# Altium footprint library 我的封装库.PcbLib: 90 footprints (part 2 of 6)
Each footprint in its own frame and in the unit in brackets; x right, y up, seen from the top. Pads: shape width x height; smd on the part's side, far side on the other; paste and mask are expansions set on the pad; w line width, h text height; cw(c..) or ccw(c..) is an arc to the next point about the centre after c.
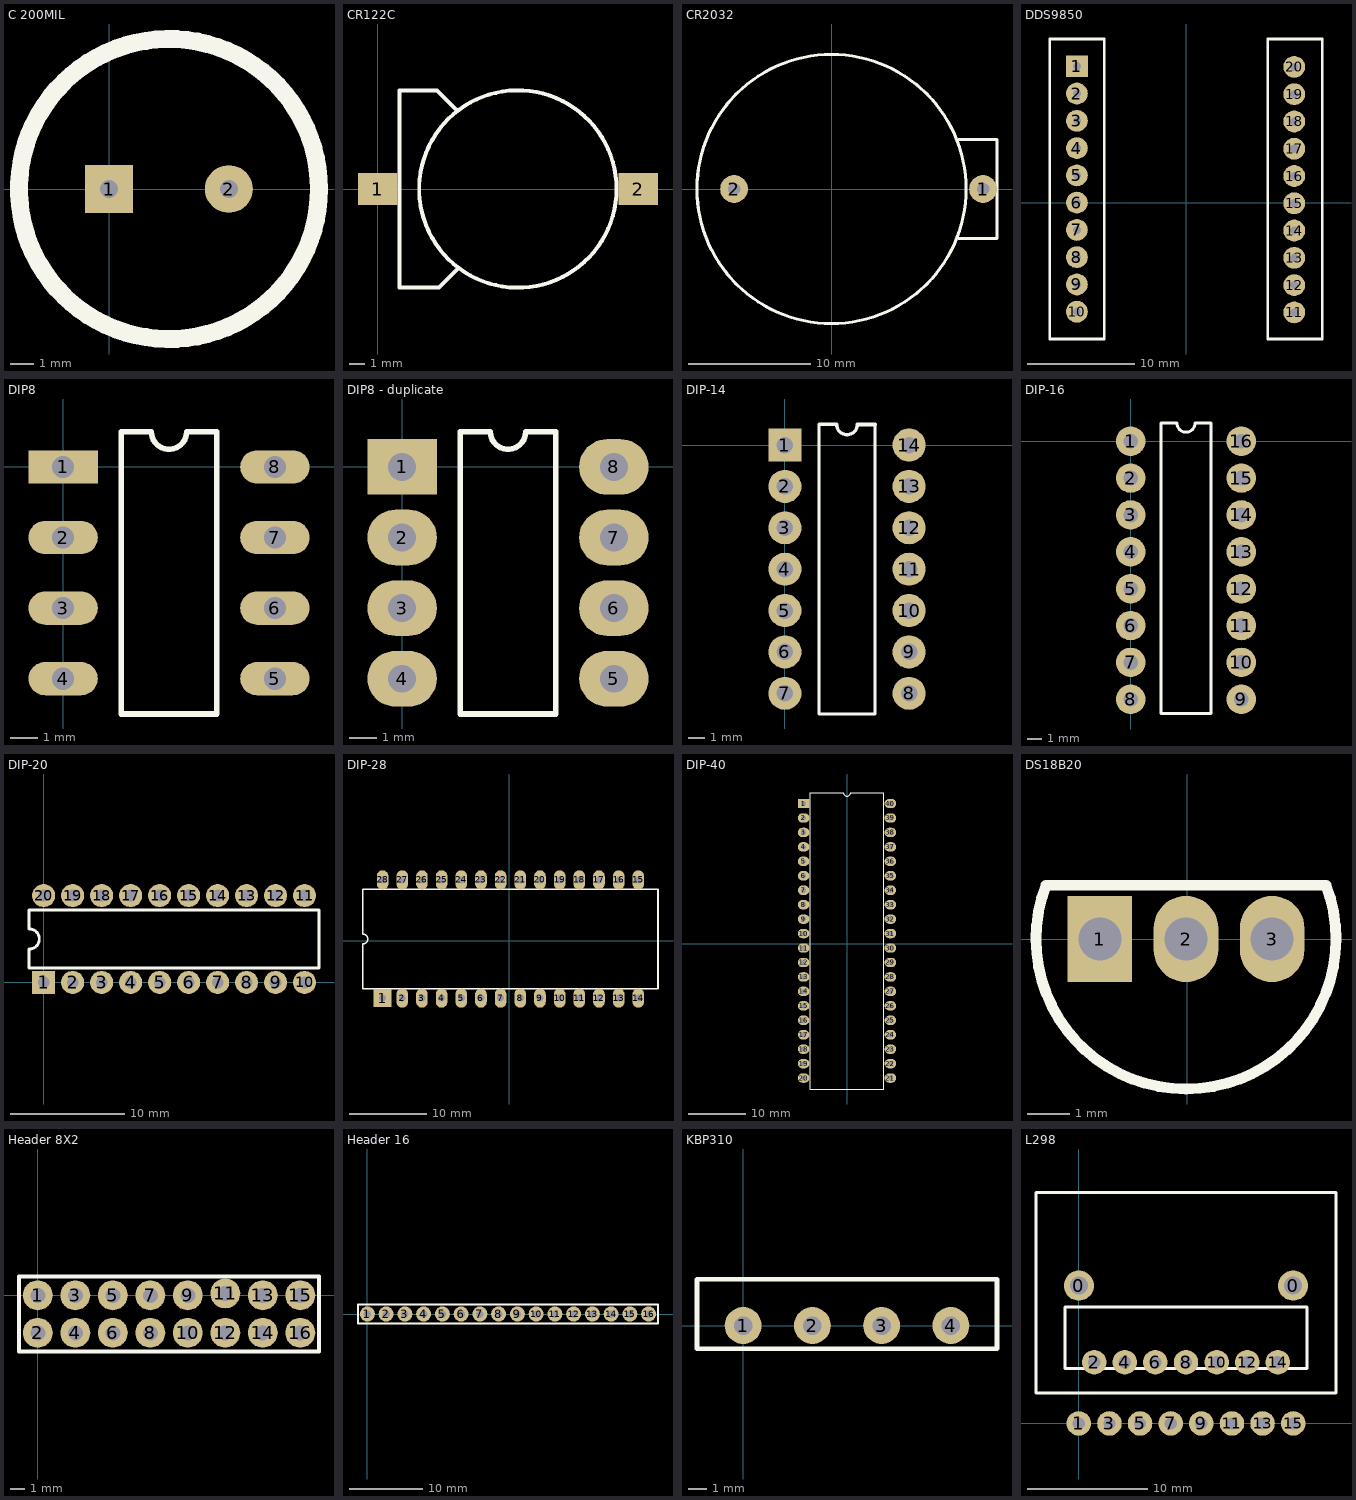
[diagram p1: the footprints below, top view; thin cyan lines are the x and y axes]

## C 200MIL [mil]
pads (2):
  rect 80x80 hole 30: 1(0,0)
  round 80 hole 30: 2(200,0)
Top Overlay:
  circle w30: c100,0 r250.6

## CR122C [mil]
pads (2):
  rect 100x80 smd: 1(0,0) 2(660,0)
Top Overlay:
  circle w10: c355,0 r250
  lines w10: 200,200 150,250 55,250 55,-250 155,-250 205,-200

## CR2032 [mil]
pads (2):
  round 90 hole 40: 1(490,0) 2(-315,0)
Top Overlay:
  circle w10: c0,0 r435
  lines w10: 410,-160 535,-160 535,160 410,160

## DDS9850 [mil]
pads (20):
  rect 80x80 hole 30: 1(-400,500)
  round 80 hole 30: 2(-400,400) 3(-400,300) 4(-400,200) 5(-400,100) 6(-400,0) 7(-400,-100) 8(-400,-200) 9(-400,-300) 10(-400,-400) 11(396.85,-402.36) 12(396.85,-302.36) 13(396.85,-202.36) 14(396.85,-102.36) 15(396.85,-2.36) 16(396.85,97.64) 17(396.85,197.64) 18(396.85,297.64) 19(396.85,397.64) 20(396.85,497.64)
Top Overlay:
  lines w10: -500,-500 -300,-500 -300,600 -500,600 -500,-500 ; 300,-500 300,600 500,600 500,-500 300,-500

## DIP8 [mm]
pads (8):
  rect 2.5x1.2 hole 0.8: 1(0,0)
  oval 2.5x1.2 hole 0.8: 2(0,-2.54) 3(0,-5.08) 4(0,-7.62) 5(7.62,-7.62) 6(7.62,-5.08) 7(7.62,-2.54) 8(7.62,0)
Top Overlay:
  lines w0.2: 2.085,-8.89 2.085,1.27 3.175,1.27 ccw(c3.81,1.27) 4.445,1.27 5.535,1.27 5.535,-8.89 2.085,-8.89

## DIP8 - duplicate [mm]
pads (8):
  rect 2.5x2 hole 1: 1(0,0)
  oval 2.5x2 hole 1: 2(0,-2.54) 3(0,-5.08) 4(0,-7.62) 5(7.62,-7.62) 6(7.62,-5.08) 7(7.62,-2.54) 8(7.62,0)
Top Overlay:
  lines w0.2: 2.085,-8.89 2.085,1.27 3.175,1.27 ccw(c3.81,1.27) 4.445,1.27 5.535,1.27 5.535,-8.89 2.085,-8.89

## DIP-14 [mil]
pads (14):
  rect 80x80 hole 40: 1(0,0)
  round 80 hole 40: 2(0,-100) 3(0,-200) 4(0,-300) 5(0,-400) 6(0,-500) 7(0,-600) 8(300,-600) 9(300,-500) 10(300,-400) 11(300,-300) 12(300,-200) 13(300,-100) 14(300,0)
Top Overlay:
  lines w7.87: 175,50 cw(c150,50) 125,50 82.09,50 82.09,-650 217.91,-650 217.91,50
  lines w10: 175,50 217.91,50

## DIP-16 [mil]
pads (16):
  round 80 hole 40: 1(0,0) 2(0,-100) 3(0,-200) 4(0,-300) 5(0,-400) 6(0,-500) 7(0,-600) 8(0,-700) 9(300,-700) 10(300,-600) 11(300,-500) 12(300,-400) 13(300,-300) 14(300,-200) 15(300,-100) 16(300,0)
Top Overlay:
  lines w7.87: 82.09,-738.19 217.91,-738.19 217.91,49.21 174.61,49.21 cw(c150,49.21) 125.39,49.21 82.09,49.21 82.09,-738.19

## DIP-20 [mil]
pads (20):
  rect 80x80 hole 40: 1(0,0)
  round 80 hole 40: 2(100,0) 3(200,0) 4(300,0) 5(400,0) 6(500,0) 7(600,0) 8(700,0) 9(800,0) 10(900,0) 11(900,300) 12(800,300) 13(700,300) 14(600,300) 15(500,300) 16(400,300) 17(300,300) 18(200,300) 19(100,300) 20(0,300)
Top Overlay:
  lines w10: -50,50 950,50 950,250 -25,250 -50,250 -50,185 cw(c-50,150) -50,115 -50,50

## DIP-28 [mm]
pads (28):
  rect 2.3x2.3 hole 0.9: 1(-16.383,-7.366)
  oval 1.5x2.5 hole 0.9: 2(-13.843,-7.366) 3(-11.303,-7.366) 4(-8.763,-7.366) 5(-6.223,-7.366) 6(-3.683,-7.366) 7(-1.143,-7.366) 8(1.397,-7.366) 9(3.937,-7.366) 10(6.477,-7.366) 11(9.017,-7.366) 12(11.557,-7.366) 13(14.097,-7.366) 14(16.637,-7.366) 15(16.637,7.874) 16(14.097,7.874) 17(11.557,7.874) 18(9.017,7.874) 19(6.477,7.874) 20(3.937,7.874) 21(1.397,7.874) 22(-1.143,7.874) 23(-3.683,7.874) 24(-6.223,7.874) 25(-8.763,7.874) 26(-11.303,7.874) 27(-13.843,7.874) 28(-16.383,7.874)
Top Overlay:
  lines w0.2: -18.923,-6.196 -18.923,-0.381 ccw(c-18.923,0.254) -18.923,0.889 -18.923,6.704 19.177,6.704 19.177,-6.196 -18.923,-6.196

## DIP-40 [mil]
pads (40):
  rect 80x65 hole 35.43: 1(-300,970)
  oval 80x65 hole 35.43: 2(-300,870) 3(-300,770) 4(-300,670) 5(-300,570) 6(-300,470) 7(-300,370) 8(-300,270) 9(-300,170) 10(-300,70) 11(-300,-30) 12(-300,-130) 13(-300,-230) 14(-300,-330) 15(-300,-430) 16(-300,-530) 17(-300,-630) 18(-300,-730) 19(-300,-830) 20(-300,-930) 21(300,-930) 22(300,-830) 23(300,-730) 24(300,-630) 25(300,-530) 26(300,-430) 27(300,-330) 28(300,-230) 29(300,-130) 30(300,-30) 31(300,70) 32(300,170) 33(300,270) 34(300,370) 35(300,470) 36(300,570) 37(300,670) 38(300,770) 39(300,870) 40(300,970)
Top Overlay:
  lines w7.87: -253.94,-1005.59 253.94,-1005.59 253.94,1045.59 25,1045.59 cw(c0,1045.59) -25,1045.59 -253.94,1045.59 -253.94,-1005.59

## DS18B20 [mil]
pads (3):
  rect 60x80 hole 40: 1(-81.26,0)
  oval 60x80 hole 40: 2(-1.26,0) 3(78.74,0)
Top Overlay:
  lines w10: -131.26,50 ccw(c-1.26,0) 128.74,50 -131.26,50

## Header 8X2 [mil]
pads (16):
  round 80 hole 40: 1(0,0) 2(0,-100) 3(100,0) 4(100,-100) 5(200,0) 6(200,-100) 7(300,0) 8(300,-100) 9(400,0) 10(400,-100) 11(500,5) 12(500,-100) 13(600,0) 14(600,-100) 15(700,0) 16(700,-100)
Top Overlay:
  lines w10: -50,-150 -50,50 750,50 750,-150 -50,-150

## Header 16 [mil]
pads (16):
  round 80 hole 40: 1(0,0) 2(100,0) 3(200,0) 4(300,0) 5(400,0) 6(500,0) 7(600,0) 8(700,0) 9(800,0) 10(900,0) 11(1000,0) 12(1100,0) 13(1200,0) 14(1300,0) 15(1400,0) 16(1500,0)
Top Overlay:
  lines w10: -50,-50 1550,-50 1550,50 -50,50 -50,-50

## KBP310 [mil]
pads (4):
  round 80 hole 40: 1(0,0) 2(150,0) 3(300,0) 4(450,0)
Top Overlay:
  lines w10: -100,-50 -50,-50 550,-50 550,100 -100,100 -100,-50

## L298 [mil]
pads (17):
  round 98.43 hole 59.06: 0(0,450) 0(700,450)
  round 80 hole 40: 1(0,0) 2(50,200) 3(100,0) 4(150,200) 5(200,0) 6(250,200) 7(300,0) 8(350,200) 9(400,0) 10(450,200) 11(500,0) 12(550,200) 13(600,0) 14(650,200) 15(700,0)
Top Overlay:
  lines w10: -140,100 840,100 840,755 -140,755 -140,100 ; -45,180 745,180 745,380 -45,380 -45,180